# Altium footprint library aiskylab-01Resistors.PcbLib: 208 footprints (part 11 of 13)
Each footprint in its own frame and in the unit in brackets; x right, y up, seen from the top. Pads: shape width x height; smd on the part's side, far side on the other; paste and mask are expansions set on the pad; w line width, h text height; cw(c..) or ccw(c..) is an arc to the next point about the centre after c.
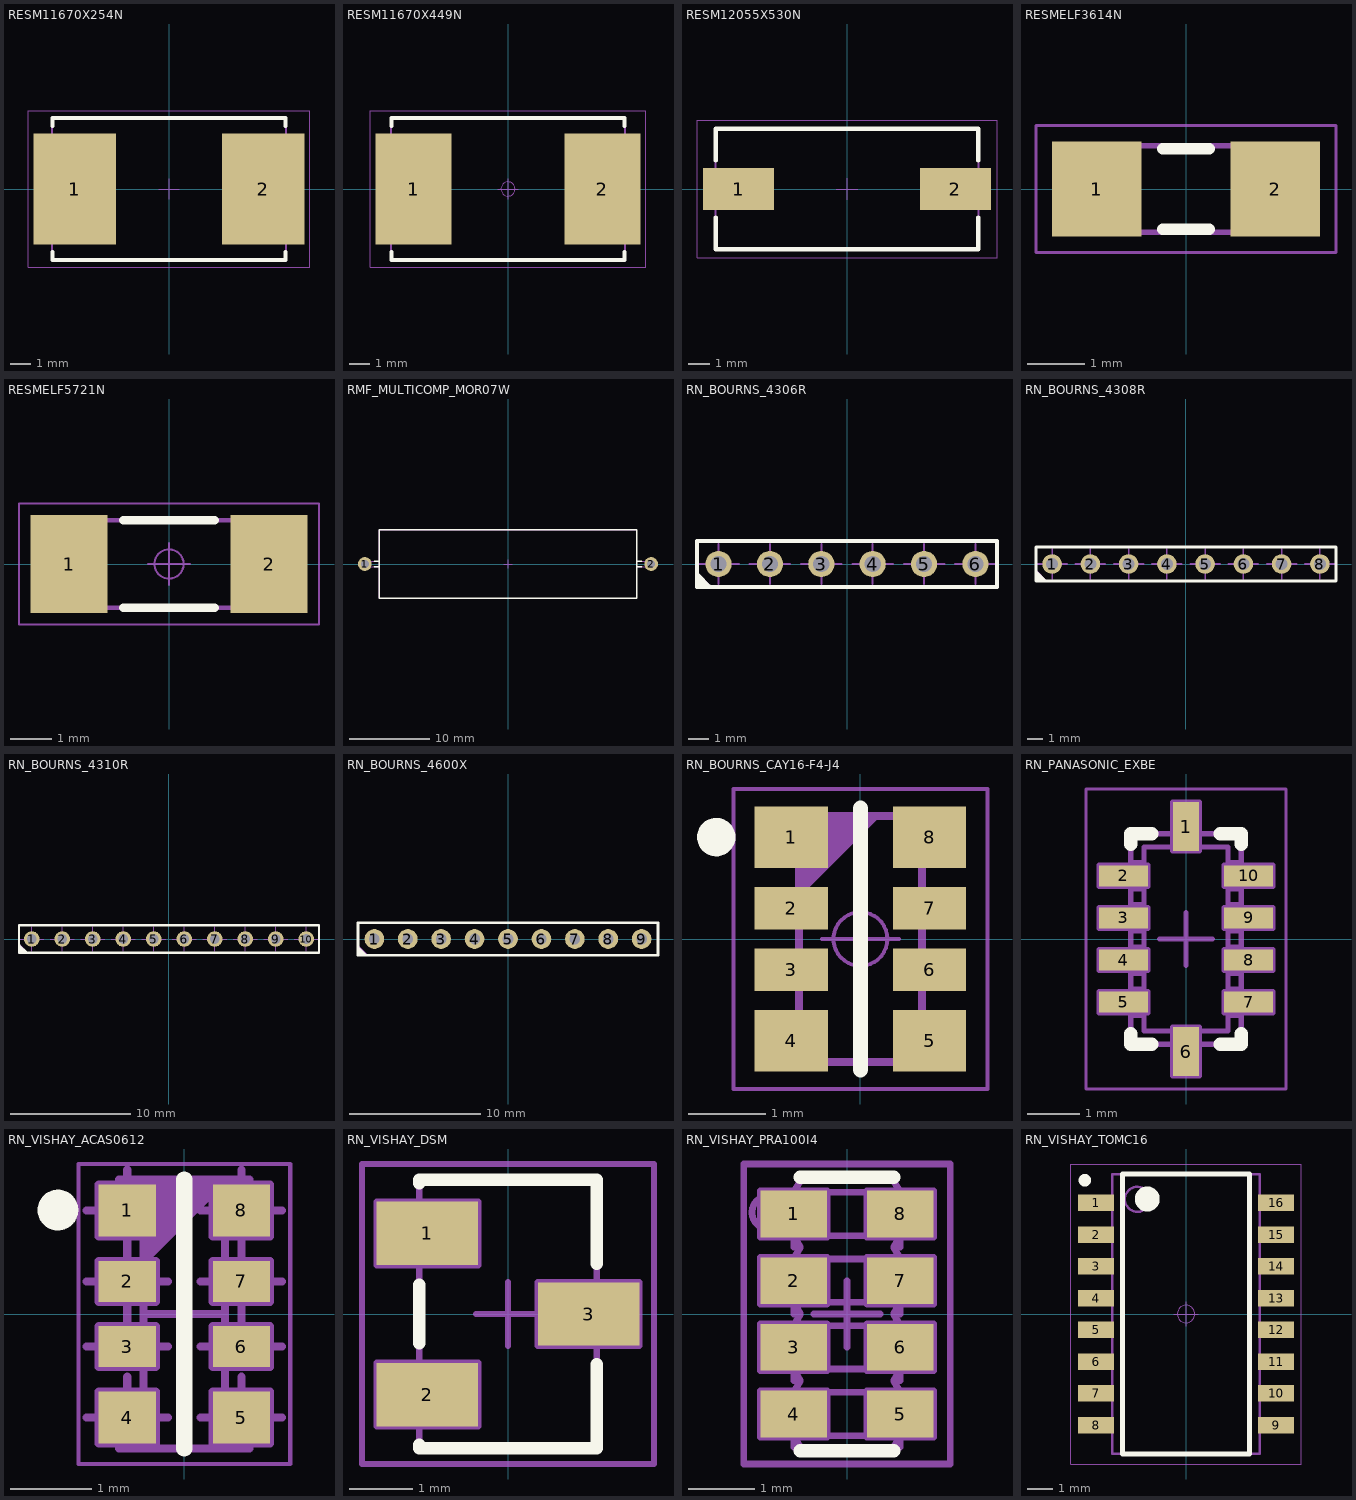
[diagram p10: the footprints below, top view; thin cyan lines are the x and y axes]

## RESM11670X254N [mm] "Resistor, Molded Body; 11.56mm L X 6.98mm W X 2.537mm H, IPC Medium Density"
height 2.54
pads (2):
  rect 4.05x5.5 smd: 1(-4.65,0) 2(4.65,0)
Top Overlay:
  lines w0.2: -5.75,-3.1 -5.75,-3.5 5.75,-3.5 5.75,-3.1 ; -5.75,3.1 -5.75,3.5 5.75,3.5 5.75,3.1
Top Designator:
  text ".Designator" at -7.618,-0.508 h1.52
Top Assembly:
  lines w0.1: -5.78,-3.49 -5.78,3.49 5.78,3.49 5.78,-3.49 -5.78,-3.49
Bottom 3D Body:
  lines w0.05: -0.5,0 0.5,0 ; 0,-0.5 0,0.5 ; -6.95,-3.85 6.95,-3.85 6.95,3.85 -6.95,3.85 -6.95,-3.85
3D body "p550-405.stp": height 0.02, standoff 0, extent -6.675,-2.75 -2.625,2.75
3D body "p550-405.stp": height 0.02, standoff 0, extent 2.625,-2.75 6.675,2.75
3D body "RESM11670X254N.stp": height 2.54, standoff 0, extent -6.186,-3.553 6.187,3.554

## RESM11670X449N [mm] "Resistor, Molded Body; 11.56mm L X 6.98mm W X 4.49mm H, IPC Medium Density"
height 4.49
pads (2):
  rect 3.75x5.5 smd: 1(-4.65,0) 2(4.65,0)
Top Overlay:
  lines w0.2: -5.75,-3.1 -5.75,-3.5 5.75,-3.5 5.75,-3.1 ; -5.75,3.1 -5.75,3.5 5.75,3.5 5.75,3.1
Top Designator:
  text ".Designator" at -7.618,-0.508 h1.52
Top Assembly:
  lines w0.1: -5.78,-3.49 -5.78,3.49 5.78,3.49 5.78,-3.49 -5.78,-3.49
Bottom 3D Body:
  circle w0.05: c0,0 r0.35
  lines w0.05: -0.5,0 0.5,0 ; 0,-0.5 0,0.5 ; -6.8,-3.85 6.8,-3.85 6.8,3.85 -6.8,3.85 -6.8,-3.85
3D body "RESM11670X449N.stp": height 4.49, standoff 0, extent -6.186,-3.553 6.187,3.554
3D body "p550-375.stp": height 0.02, standoff 0, extent -6.525,-2.725 -2.775,2.775
3D body "p550-375.stp": height 0.02, standoff 0, extent 2.8,-2.75 6.55,2.75

## RESM12055X530N [mm] "Resistor, Molded Body; 12mm L X 5.5mm W X 5.3mm H, IPC Medium Density"
height 5.3
pads (2):
  rect 3.25x1.9 smd: 1(-4.95,0) 2(4.95,0)
Top Overlay:
  lines w0.2: -6,-1.3 -6,-2.75 6,-2.75 6,-1.3 ; -6,1.3 -6,2.75 6,2.75 6,1.3
Top Designator:
  text ".Designator" at -7.618,-0.508 h1.52
Top Assembly:
  lines w0.1: -6,-2.75 -6,2.75 6,2.75 6,-2.75 -6,-2.75
Bottom 3D Body:
  lines w0.05: -0.5,0 0.5,0 ; 0,-0.5 0,0.5 ; -6.85,-3.15 6.85,-3.15 6.85,3.15 -6.85,3.15 -6.85,-3.15
3D body "p325-190.stp": height 0.02, standoff 0, extent -6.575,-0.95 -3.325,0.95
3D body "p325-190.stp": height 0.02, standoff 0, extent 3.325,-0.95 6.575,0.95
3D body "RESM12055X530N.stp": height 5, standoff 0, extent -6,-2.9 6,2.9

## RESMELF3614N [mm] "MELF Resistor, 2-Leads, Body 3.6x1.4mm, IPC Medium Density"
height 1.5
pads (2):
  rect 1.55x1.65 smd: 1(-1.55,0) 2(1.55,0)
Top Overlay:
  lines w0.2: -0.4,-0.7 0.4,-0.7 ; -0.4,0.7 0.4,0.7
Top Designator:
  text ".Designator" at -7.618,-0.508 h1.52
Top Assembly:
  lines w0.1: -1.9,-0.75 -1.9,0.75 1.9,0.75 1.9,-0.75 -1.9,-0.75
Bottom 3D Body:
  lines w0.05: -2.6,-1.1 -2.6,1.1 2.6,1.1 2.6,-1.1 -2.6,-1.1
3D body "p165-155.stp": height 0.02, standoff 0, extent 0.775,-0.825 2.325,0.825
3D body "RESMELF3614N.stp": height 1.5, standoff 0, extent -1.9,-0.75 1.9,0.75
3D body "p165-155.stp": height 0.02, standoff 0, extent -2.325,-0.825 -0.775,0.825

## RESMELF5721N [mm] "MELF Resistor, 2-Leads, Body 5.7x2.1mm, IPC Medium Density"
height 2.2
pads (2):
  rect 1.85x2.35 smd: 1(-2.4,0) 2(2.4,0)
Top Overlay:
  lines w0.2: -1.1,-1.05 1.1,-1.05 ; -1.1,1.05 1.1,1.05
Top Designator:
  text ".Designator" at -7.618,-0.508 h1.52
Top Assembly:
  lines w0.1: -2.85,-1.05 -2.85,1.05 2.85,1.05 2.85,-1.05 -2.85,-1.05
Bottom 3D Body:
  circle w0.05: c0,0 r0.35
  lines w0.05: -0.5,0 0.5,0 ; 0,-0.5 0,0.5 ; -3.6,-1.45 3.6,-1.45 3.6,1.45 -3.6,1.45 -3.6,-1.45
3D body "p235-185.stp": height 0.02, standoff 0, extent -3.325,-1.175 -1.475,1.175
3D body "p235-185.stp": height 0.02, standoff 0, extent 1.475,-1.175 3.325,1.175
3D body "RESMELF5822N.stp": height 2.3, standoff 0.1, extent -2.9,-1.1 2.9,1.1

## RMF_MULTICOMP_MOR07W [mm] "Resistor, Axial, Leads Spacing 35.56mm, Lead Dia. 0.7, Body Lengh 32mm, Diameter 8.5mm"
height 8.5
pads (2):
  round 1.7 hole 1: 1(-17.78,0) 2(17.78,0)
Top Overlay:
  lines w0.2: -16.58,-0.35 -16,-0.35 ; -16.58,0.35 -16,0.35 ; 16,-0.35 16.58,-0.35 ; 16,0.35 16.58,0.35 ; -16,-4.25 16,-4.25 16,4.25 -16,4.25 -16,-4.25
Top Designator:
  text ".Designator" at -7.617,-0.508 h1.52
Top Assembly:
  lines w0.1: -16,-0.35 -17.78,-0.35 cw(c-17.78,0) -17.78,0.35 -16,0.35 ; 16,-0.35 17.78,-0.35 ccw(c17.78,0) 17.78,0.35 16,0.35 ; -16,-4.25 -16,4.25 16,4.25 16,-4.25 -16,-4.25
Top Dimensions:
  lines w0.1: -18.28,0 -17.78,0 ; -17.78,-0.5 -17.78,0 ; -17.78,0.5 -17.78,0 ; -17.28,0 -17.78,0 ; -0.5,0 0,0 ; 0,-0.5 0,0 ; 0,0.5 0,0 ; 0.5,0 0,0 ; 17.28,0 17.78,0 ; 17.78,-0.5 17.78,0 ; 17.78,0.5 17.78,0 ; 18.28,0 17.78,0
3D body "v200-130.stp": height 0.02, standoff -1.65, extent 16.78,-1 18.78,1
3D body "v200-130.stp": height 0.02, standoff -1.65, extent -18.78,-1 -16.78,1
3D body "RMF_MULTICOMP_MOR07W.stp": height 8.5, standoff -3.8, extent -18.13,-4.25 18.13,4.25

## RN_BOURNS_4306R [mm] "SIP-6 Resistor Network, Body 14.83 x 2.16mm, Bourns Serie 4300R"
height 4.95
pads (6):
  round 1.3 hole 0.8: 1(-6.35,0) 2(-3.81,0) 3(-1.27,0) 4(1.27,0) 5(3.81,0) 6(6.35,0)
Top Overlay:
  lines w0.2: -7.4,-0.975 -7.25,-1.125 ; -7.4,-0.825 -7.1,-1.125 ; -7.4,-0.7 -6.975,-1.125 ; -7.4,-0.525 -6.8,-1.125 ; -7.415,-1.13 7.415,-1.13 7.415,1.13 -7.415,1.13 -7.415,-1.13
Top Designator:
  text ".Designator" at -7.618,-0.508 h1.52
Top Assembly:
  lines w0.1: -7.4,-1.05 -7.325,-1.125 ; -7.4,-0.95 -7.225,-1.125 ; -7.4,-0.875 -7.15,-1.125 ; -7.4,-0.8 -7.075,-1.125 ; -7.4,-0.725 -7,-1.125 ; -7.4,-0.65 -6.925,-1.125 ; -7.4,-0.575 -6.85,-1.125 ; -7.4,-0.45 -6.725,-1.125 ; -7.415,-1.13 -7.415,1.13 7.415,1.13 7.415,-1.13 -7.415,-1.13
Top Dimensions:
  lines w0.1: -7.35,0 -6.35,0 ; -6.35,-1 -6.35,0 ; -6.35,1 -6.35,0 ; -5.35,0 -6.35,0 ; -4.81,0 -3.81,0 ; -3.81,-1 -3.81,0 ; -3.81,1 -3.81,0 ; -2.81,0 -3.81,0 ; -2.27,0 -1.27,0 ; -1.27,-1 -1.27,0 ; -1.27,1 -1.27,0 ; -0.27,0 -1.27,0 ; 0.27,0 1.27,0 ; 1.27,-1 1.27,0 ; 1.27,1 1.27,0 ; 2.27,0 1.27,0 ; 2.81,0 3.81,0 ; 3.81,-1 3.81,0 ; 3.81,1 3.81,0 ; 4.81,0 3.81,0 ; 5.35,0 6.35,0 ; 6.35,-1 6.35,0 ; 6.35,1 6.35,0 ; 7.35,0 6.35,0
3D body "v200-130.stp": height 0.02, standoff -1.65, extent -4.81,-1 -2.81,1
3D body "v200-130.stp": height 0.02, standoff -1.65, extent -7.35,-1 -5.35,1
3D body "v200-130.stp": height 0.02, standoff -1.65, extent 2.81,-1 4.81,1
3D body "v200-130.stp": height 0.02, standoff -1.65, extent 0.27,-1 2.27,1
3D body "v200-130.stp": height 0.02, standoff -1.65, extent -2.27,-1 -0.27,1
3D body "v200-130.stp": height 0.02, standoff -1.65, extent 5.35,-1 7.35,1
3D body "RN_BOURNS_4306R.stp": height 4.95, standoff -3.79, extent -7.415,-1.13 7.415,1.13

## RN_BOURNS_4308R [mm] "SIP-8 Resistor Network, Body 19.92x 2.16mm, Bourns Serie 4300R"
height 4.95
pads (8):
  round 1.3 hole 0.8: 1(-8.89,0) 2(-6.35,0) 3(-3.81,0) 4(-1.27,0) 5(1.27,0) 6(3.81,0) 7(6.35,0) 8(8.89,0)
Top Overlay:
  lines w0.2: -9.94,-0.975 -9.79,-1.125 ; -9.94,-0.825 -9.64,-1.125 ; -9.94,-0.7 -9.515,-1.125 ; -9.94,-0.525 -9.34,-1.125 ; -9.955,-1.13 9.955,-1.13 9.955,1.13 -9.955,1.13 -9.955,-1.13
Top Designator:
  text ".Designator" at -7.618,-0.508 h1.52
Top Assembly:
  lines w0.1: -9.94,-1.05 -9.865,-1.125 ; -9.94,-0.95 -9.765,-1.125 ; -9.94,-0.875 -9.69,-1.125 ; -9.94,-0.8 -9.615,-1.125 ; -9.94,-0.725 -9.54,-1.125 ; -9.94,-0.65 -9.465,-1.125 ; -9.94,-0.575 -9.39,-1.125 ; -9.94,-0.45 -9.265,-1.125 ; -9.955,-1.13 -9.955,1.13 9.955,1.13 9.955,-1.13 -9.955,-1.13
Top Dimensions:
  lines w0.1: -9.89,0 -8.89,0 ; -8.89,-1 -8.89,0 ; -8.89,1 -8.89,0 ; -7.89,0 -8.89,0 ; -7.35,0 -6.35,0 ; -6.35,-1 -6.35,0 ; -6.35,1 -6.35,0 ; -5.35,0 -6.35,0 ; -4.81,0 -3.81,0 ; -3.81,-1 -3.81,0 ; -3.81,1 -3.81,0 ; -2.81,0 -3.81,0 ; -2.27,0 -1.27,0 ; -1.27,-1 -1.27,0 ; -1.27,1 -1.27,0 ; -0.27,0 -1.27,0 ; 0.27,0 1.27,0 ; 1.27,-1 1.27,0 ; 1.27,1 1.27,0 ; 2.27,0 1.27,0 ; 2.81,0 3.81,0 ; 3.81,-1 3.81,0 ; 3.81,1 3.81,0 ; 4.81,0 3.81,0 ; 5.35,0 6.35,0 ; 6.35,-1 6.35,0 ; 6.35,1 6.35,0 ; 7.35,0 6.35,0 ; 7.89,0 8.89,0 ; 8.89,-1 8.89,0 ; 8.89,1 8.89,0 ; 9.89,0 8.89,0
3D body "v200-130.stp": height 0.02, standoff -1.65, extent -4.81,-1 -2.81,1
3D body "v200-130.stp": height 0.02, standoff -1.65, extent -7.35,-1 -5.35,1
3D body "v200-130.stp": height 0.02, standoff -1.65, extent 2.81,-1 4.81,1
3D body "v200-130.stp": height 0.02, standoff -1.65, extent 0.27,-1 2.27,1
3D body "v200-130.stp": height 0.02, standoff -1.65, extent 7.89,-1 9.89,1
3D body "v200-130.stp": height 0.02, standoff -1.65, extent -2.27,-1 -0.27,1
3D body "v200-130.stp": height 0.02, standoff -1.65, extent -9.89,-1 -7.89,1
3D body "v200-130.stp": height 0.02, standoff -1.65, extent 5.35,-1 7.35,1
3D body "RN_BOURNS_4308R.stp": height 4.95, standoff -3.79, extent -9.955,-1.13 9.955,1.13

## RN_BOURNS_4310R [mm] "SIP-10 Resistor Network, Body 24.99x 2.16mm, Bourns Serie 4300R"
height 4.95
pads (10):
  round 1.3 hole 0.8: 1(-11.43,0) 2(-8.89,0) 3(-6.35,0) 4(-3.81,0) 5(-1.27,0) 6(1.27,0) 7(3.81,0) 8(6.35,0) 9(8.89,0) 10(11.43,0)
Top Overlay:
  lines w0.2: -12.48,-0.975 -12.33,-1.125 ; -12.48,-0.825 -12.18,-1.125 ; -12.48,-0.7 -12.055,-1.125 ; -12.48,-0.525 -11.88,-1.125 ; -12.495,-1.13 12.495,-1.13 12.495,1.13 -12.495,1.13 -12.495,-1.13
Top Designator:
  text ".Designator" at -7.618,-0.508 h1.52
Top Assembly:
  lines w0.1: -12.48,-1.05 -12.405,-1.125 ; -12.48,-0.95 -12.305,-1.125 ; -12.48,-0.875 -12.23,-1.125 ; -12.48,-0.8 -12.155,-1.125 ; -12.48,-0.725 -12.08,-1.125 ; -12.48,-0.65 -12.005,-1.125 ; -12.48,-0.575 -11.93,-1.125 ; -12.48,-0.45 -11.805,-1.125 ; 12.495,-1.13 12.495,1.13 ; 12.495,-1.13 12.495,1.13 ; 12.495,-1.13 -12.495,-1.13 -12.495,1.13 12.495,1.13
Top Dimensions:
  lines w0.1: -12.43,0 -11.43,0 ; -11.43,-1 -11.43,0 ; -11.43,1 -11.43,0 ; -10.43,0 -11.43,0 ; -9.89,0 -8.89,0 ; -8.89,-1 -8.89,0 ; -8.89,1 -8.89,0 ; -7.89,0 -8.89,0 ; -7.35,0 -6.35,0 ; -6.35,-1 -6.35,0 ; -6.35,1 -6.35,0 ; -5.35,0 -6.35,0 ; -4.81,0 -3.81,0 ; -3.81,-1 -3.81,0 ; -3.81,1 -3.81,0 ; -2.81,0 -3.81,0 ; -2.27,0 -1.27,0 ; -1.27,-1 -1.27,0 ; -1.27,1 -1.27,0 ; -0.27,0 -1.27,0 ; 0.27,0 1.27,0 ; 1.27,-1 1.27,0 ; 1.27,1 1.27,0 ; 2.27,0 1.27,0 ; 2.81,0 3.81,0 ; 3.81,-1 3.81,0 ; 3.81,1 3.81,0 ; 4.81,0 3.81,0 ; 5.35,0 6.35,0 ; 6.35,-1 6.35,0 ; 6.35,1 6.35,0 ; 7.35,0 6.35,0 ; 7.89,0 8.89,0 ; 8.89,-1 8.89,0 ; 8.89,1 8.89,0 ; 9.89,0 8.89,0 ; 10.43,0 11.43,0 ; 11.43,-1 11.43,0 ; 11.43,1 11.43,0 ; 12.43,0 11.43,0
3D body "v200-130.stp": height 0.02, standoff -1.65, extent -12.43,-1 -10.43,1
3D body "v200-130.stp": height 0.02, standoff -1.65, extent -4.81,-1 -2.81,1
3D body "v200-130.stp": height 0.02, standoff -1.65, extent -7.35,-1 -5.35,1
3D body "v200-130.stp": height 0.02, standoff -1.65, extent 2.81,-1 4.81,1
3D body "v200-130.stp": height 0.02, standoff -1.65, extent 0.27,-1 2.27,1
3D body "v200-130.stp": height 0.02, standoff -1.65, extent 10.43,-1 12.43,1
3D body "v200-130.stp": height 0.02, standoff -1.65, extent 7.89,-1 9.89,1
3D body "v200-130.stp": height 0.02, standoff -1.65, extent -2.27,-1 -0.27,1
3D body "v200-130.stp": height 0.02, standoff -1.65, extent -9.89,-1 -7.89,1
3D body "v200-130.stp": height 0.02, standoff -1.65, extent 5.35,-1 7.35,1
3D body "RN_BOURNS_4310R.stp": height 4.95, standoff -3.79, extent -12.495,-1.13 12.495,1.13

## RN_BOURNS_4600X [mm] "SIP-9 Resistor Network, Body 22.81x 2.49mm, Bourns Serie 4600X"
height 5.08
pads (9):
  round 1.5 hole 0.8: 1(-10.16,0) 2(-7.62,0) 3(-5.08,0) 4(-2.54,0) 5(0,0) 6(2.54,0) 7(5.08,0) 8(7.62,0) 9(10.16,0)
Top Overlay:
  lines w0.2: -11.39,-1.09 -11.24,-1.24 ; -11.39,-0.94 -11.09,-1.24 ; -11.39,-0.815 -10.965,-1.24 ; -11.39,-0.64 -10.79,-1.24 ; -11.405,-1.245 11.405,-1.245 11.405,1.245 -11.405,1.245 -11.405,-1.245
Top Designator:
  text ".Designator" at -7.618,-0.508 h1.52
Top Assembly:
  lines w0.1: -11.39,-1.165 -11.315,-1.24 ; -11.39,-1.065 -11.215,-1.24 ; -11.39,-0.99 -11.14,-1.24 ; -11.39,-0.915 -11.065,-1.24 ; -11.39,-0.84 -10.99,-1.24 ; -11.39,-0.765 -10.915,-1.24 ; -11.39,-0.69 -10.84,-1.24 ; -11.39,-0.565 -10.715,-1.24 ; -11.405,-1.245 -11.405,1.245 11.405,1.245 11.405,-1.245 -11.405,-1.245
Top Dimensions:
  lines w0.127: -10.66,0 -10.16,0 ; -10.16,-0.5 -10.16,0 ; -10.16,0.5 -10.16,0 ; -9.66,0 -10.16,0 ; -8.12,0 -7.62,0 ; -7.62,-0.5 -7.62,0 ; -7.62,0.5 -7.62,0 ; -7.12,0 -7.62,0 ; -5.58,0 -5.08,0 ; -5.08,-0.5 -5.08,0 ; -5.08,0.5 -5.08,0 ; -4.58,0 -5.08,0 ; -3.04,0 -2.54,0 ; -2.54,-0.5 -2.54,0 ; -2.54,0.5 -2.54,0 ; -2.04,0 -2.54,0 ; -0.5,0 0,0 ; 0,-0.5 0,0 ; 0,0.5 0,0 ; 0.5,0 0,0 ; 2.04,0 2.54,0 ; 2.54,-0.5 2.54,0 ; 2.54,0.5 2.54,0 ; 3.04,0 2.54,0 ; 4.58,0 5.08,0 ; 5.08,-0.5 5.08,0 ; 5.08,0.5 5.08,0 ; 5.58,0 5.08,0 ; 7.12,0 7.62,0 ; 7.62,-0.5 7.62,0 ; 7.62,0.5 7.62,0 ; 8.12,0 7.62,0 ; 9.66,0 10.16,0 ; 10.16,-0.5 10.16,0 ; 10.16,0.5 10.16,0 ; 10.66,0 10.16,0
3D body "v200-130.stp": height 0.02, standoff -1.65, extent -6.08,-1 -4.08,1
3D body "v200-130.stp": height 0.02, standoff -1.65, extent 4.08,-1 6.08,1
3D body "v200-130.stp": height 0.02, standoff -1.65, extent -11.16,-1 -9.16,1
3D body "v200-130.stp": height 0.02, standoff -1.65, extent -3.54,-1 -1.54,1
3D body "v200-130.stp": height 0.02, standoff -1.65, extent -8.62,-1 -6.62,1
3D body "v200-130.stp": height 0.02, standoff -1.65, extent 1.54,-1 3.54,1
3D body "v200-130.stp": height 0.02, standoff -1.65, extent -1,-1 1,1
3D body "v200-130.stp": height 0.02, standoff -1.65, extent 9.16,-1 11.16,1
3D body "v200-130.stp": height 0.02, standoff -1.65, extent 6.62,-1 8.62,1
3D body "RN_BOURNS_4600X.stp": height 5.08, standoff -3.43, extent -11.405,-1.245 11.405,1.245

## RN_BOURNS_CAY16-F4-J4 [mm] "Resistor, Chip Array, Convex S Version, Pitch 0.80mm, 8-Leads,1.6x3.2mm, BOURNS Type CAY16-F4 or J4, IPC Medium Density"
height 0.6
pads (8):
  rect 0.95x0.8 smd: 1(-0.9,1.325) 4(-0.9,-1.325) 5(0.9,-1.325) 8(0.9,1.325)
  rect 0.95x0.55 smd: 2(-0.9,0.4) 3(-0.9,-0.4) 6(0.9,-0.4) 7(0.9,0.4)
Top Overlay:
  circle w0.25: c-1.875,1.325 r0.125
  lines w0.2: 0,-1.7 0,1.7
Top Designator:
  text ".Designator" at -7.843,-0.508 h1.52
Top Assembly:
  lines w0.1: -0.8,-1.6 -0.8,1.6 0.8,1.6 0.8,-1.6 -0.8,-1.6 ; -0.8,0.6 0.2,1.6 -0.8,0.6 ; -0.8,0.7 0.1,1.6 -0.8,0.7 ; -0.8,0.8 0,1.6 -0.8,0.8 ; -0.8,0.9 -0.1,1.6 -0.8,0.9 ; -0.8,1 -0.2,1.6 -0.8,1 ; -0.8,1.1 -0.3,1.6 -0.8,1.1 ; -0.8,1.2 -0.4,1.6 -0.8,1.2 ; -0.8,1.3 -0.5,1.6 -0.8,1.3 ; -0.8,1.4 -0.6,1.6 -0.8,1.4 ; -0.8,1.5 -0.7,1.6 -0.8,1.5
Bottom 3D Body:
  circle w0.05: c0,0 r0.35
  lines w0.05: -0.5,0 0.5,0 ; 0,-0.5 0,0.5 ; -1.65,-1.95 -1.65,1.95 1.65,1.95 1.65,-1.95 -1.65,-1.95
3D body "p095-055.stp": height 0.02, standoff 0, extent -1.375,-0.675 -0.425,-0.125
3D body "p095-080.stp": height 0.02, standoff 0, extent -1.375,-1.725 -0.425,-0.925
3D body "p095-055.stp": height 0.02, standoff 0, extent -1.375,0.125 -0.425,0.675
3D body "p095-080.stp": height 0.02, standoff 0, extent -1.375,0.925 -0.425,1.725
3D body "p095-055.stp": height 0.02, standoff 0, extent 0.425,-0.675 1.375,-0.125
3D body "p095-080.stp": height 0.02, standoff 0, extent 0.425,-1.725 1.375,-0.925
3D body "p095-055.stp": height 0.02, standoff 0, extent 0.425,0.125 1.375,0.675
3D body "p095-080.stp": height 0.02, standoff 0, extent 0.425,0.925 1.375,1.725
3D body "RN_BOURNS_CAY16-F4-J4.stp": height 0.5, standoff 0, extent -0.8,-1.65 0.8,1.65

## RN_PANASONIC_EXBE [mm] "Resistor, Chip Array, Concave, Pitch 0.80mm, 10 Pin, 2.1mm W X 4.0mm L X 2.3mm H, Type EXBE"
height 2.3
pads (10):
  rect 0.5x0.925 smd: 1(0,2.138) 6(0,-2.137)
  rect 0.925x0.4 smd: 2(-1.188,1.2) 3(-1.188,0.4) 4(-1.188,-0.4) 5(-1.188,-1.2) 7(1.188,-1.2) 8(1.188,-0.4) 9(1.188,0.4) 10(1.188,1.2)
Top Overlay:
  lines w0.25: -1.05,-1.8 -1.05,-2 -0.65,-2 ; -1.05,1.8 -1.05,2 -0.65,2 ; 0.65,-2 1.05,-2 1.05,-1.8 ; 0.65,2 1.05,2 1.05,1.8
Top Designator:
  text ".Designator" at -7.618,-0.508 h1.52
Top Assembly:
  lines w0.1: -1.05,-1.45 -0.8,-1.45 ; -1.05,-0.95 -0.8,-0.95 ; -1.05,-0.65 -0.8,-0.65 ; -1.05,-0.15 -0.8,-0.15 ; -1.05,0.15 -0.8,0.15 ; -1.05,0.65 -0.8,0.65 ; -1.05,0.95 -0.8,0.95 ; -1.05,1.45 -0.8,1.45 ; -0.25,-2 -0.25,-1.75 ; -0.25,1.75 -0.25,2 ; 0.25,-2 0.25,-1.75 ; 0.25,1.75 0.25,2 ; 0.8,-1.45 1.05,-1.45 ; 0.8,-0.95 1.05,-0.95 ; 0.8,-0.65 1.05,-0.65 ; 0.8,-0.15 1.05,-0.15 ; 0.8,0.15 1.05,0.15 ; 0.8,0.65 1.05,0.65 ; 0.8,0.95 1.05,0.95 ; 0.8,1.45 1.05,1.45 ; -1.05,-2 -1.05,-1.35 ccw(c-1.05,-1.2) -1.05,-1.05 -1.05,-0.55 ccw(c-1.05,-0.4) -1.05,-0.25 -1.05,0.25 ccw(c-1.05,0.4) -1.05,0.55 -1.05,1.05 ccw(c-1.05,1.2) -1.05,1.35 -1.05,2 -0.15,2 ccw(c0,2) 0.15,2 1.05,2 1.05,1.35 ccw(c1.05,1.2) 1.05,1.05 1.05,0.55 ccw(c1.05,0.4) 1.05,0.25 1.05,-0.25 ccw(c1.05,-0.4) 1.05,-0.55 1.05,-1.05 ccw(c1.05,-1.2) 1.05,-1.35 1.05,-2 0.15,-2 ccw(c0,-2) -0.15,-2 -1.05,-2 ; -0.8,-1.75 -0.8,1.75 0.8,1.75 0.8,-1.75 -0.8,-1.75
Top Dimensions:
  lines w0.1: -0.5,0 0,0 ; 0,-0.5 0,0 ; 0,0.5 0,0 ; 0.5,0 0,0 ; -1.65,-1.4 -1.65,-1 ; -1.65,-1.4 -0.725,-1.4 -0.725,-1 -1.65,-1 ; -1.65,-1.4 -1.188,-1.2 -1.65,-1 ; -1.65,-0.6 -1.65,-0.2 ; -1.65,-0.6 -0.725,-0.6 -0.725,-0.2 -1.65,-0.2 ; -1.65,-0.6 -1.188,-0.4 -1.65,-0.2 ; -1.65,0.2 -1.65,0.6 ; -1.65,0.2 -0.725,0.2 -0.725,0.6 -1.65,0.6 ; -1.65,0.2 -1.188,0.4 -1.65,0.6 ; -1.65,1 -1.65,1.4 ; -1.65,1 -0.725,1 -0.725,1.4 -1.65,1.4 ; -1.65,1 -1.188,1.2 -1.65,1.4 ; -0.25,-2.6 0.25,-2.6 ; -0.25,-2.6 -0.25,-1.675 0.25,-1.675 0.25,-2.6 ; -0.25,-2.6 0,-2.137 0.25,-2.6 ; -0.25,2.6 0.25,2.6 ; -0.25,2.6 -0.25,1.675 0.25,1.675 0.25,2.6 ; -0.25,2.6 0,2.138 0.25,2.6 ; 1.65,-1.4 1.65,-1 ; 1.65,-1.4 0.725,-1.4 0.725,-1 1.65,-1 ; 1.65,-1.4 1.188,-1.2 1.65,-1 ; 1.65,-0.6 1.65,-0.2 ; 1.65,-0.6 0.725,-0.6 0.725,-0.2 1.65,-0.2 ; 1.65,-0.6 1.188,-0.4 1.65,-0.2 ; 1.65,0.2 1.65,0.6 ; 1.65,0.2 0.725,0.2 0.725,0.6 1.65,0.6 ; 1.65,0.2 1.188,0.4 1.65,0.6 ; 1.65,1 1.65,1.4 ; 1.65,1 0.725,1 0.725,1.4 1.65,1.4 ; 1.65,1 1.188,1.2 1.65,1.4
Bottom 3D Body:
  lines w0.05: -1.9,-2.85 -1.9,2.85 1.9,2.85 1.9,-2.85 -1.9,-2.85
3D body "p093-040.stp": height 0.02, standoff 0, extent -1.665,-0.6 -0.735,-0.2
3D body "p093-040.stp": height 0.02, standoff 0, extent -1.665,-1.4 -0.735,-1
3D body "p093-040.stp": height 0.02, standoff 0, extent -1.665,1 -0.735,1.4
3D body "p093-040.stp": height 0.02, standoff 0, extent -1.665,0.2 -0.735,0.6
3D body "p093-040.stp": height 0.02, standoff 0, extent 0.71,-1.4 1.64,-1
3D body "p093-040.stp": height 0.02, standoff 0, extent 0.71,-0.6 1.64,-0.2
3D body "p093-040.stp": height 0.02, standoff 0, extent 0.71,0.2 1.64,0.6
3D body "p093-040.stp": height 0.02, standoff 0, extent 0.71,1 1.64,1.4
3D body "p093-040.stp": height 0.02, standoff 0, extent -0.2,-2.615 0.2,-1.685
3D body "p093-040.stp": height 0.02, standoff 0, extent -0.2,1.66 0.2,2.59
3D body "RN_PANASONIC_EXBE.stp": height 0.65, standoff 0, extent -1.05,-2 1.05,2

## RN_VISHAY_ACAS0612 [mm] "Resistor, Chip Array, Convex S Version, Pitch 0.80mm, 8-Leads,1.5x3.2mm, VISHAY Type ACAS 0612, IPC Medium Density"
height 0.45
pads (8):
  rect 0.7x0.64 smd: 1(-0.7,1.27) 4(-0.7,-1.27) 5(0.7,-1.27) 8(0.7,1.27)
  rect 0.7x0.5 smd: 2(-0.7,0.4) 3(-0.7,-0.4) 6(0.7,-0.4) 7(0.7,0.4)
Top Overlay:
  circle w0.25: c-1.55,1.275 r0.125
  lines w0.2: 0,-1.65 0,1.65
Top Designator:
  text ".Designator" at -7.855,-0.508 h1.52
Top Assembly:
  lines w0.1: -0.5,-1.65 -0.5,1.65 ; -0.5,-1.027 cw(c-0.6,-0.825) -0.6,-1.05 -0.8,-1.05 -0.8,-1.65 0.8,-1.65 0.8,-1.05 0.6,-1.05 cw(c0.6,-0.825) 0.5,-1.027 ; -0.5,-0.623 ccw(c-0.6,-0.825) -0.6,-0.6 -0.8,-0.6 -0.8,-0.2 -0.6,-0.2 ccw(c-0.6,0) -0.5,-0.173 ; -0.5,0.173 ccw(c-0.6,0) -0.6,0.2 -0.8,0.2 -0.8,0.6 -0.6,0.6 ccw(c-0.6,0.825) -0.5,0.623 ; -0.5,1.027 ccw(c-0.6,0.825) -0.6,1.05 -0.8,1.05 -0.8,1.65 0.8,1.65 0.8,1.05 0.6,1.05 ccw(c0.6,0.825) 0.5,1.027 ; 0.5,-1.65 0.5,1.65 ; 0.5,-0.623 cw(c0.6,-0.825) 0.6,-0.6 0.8,-0.6 0.8,-0.2 0.6,-0.2 cw(c0.6,0) 0.5,-0.173 ; 0.5,0.173 cw(c0.6,0) 0.6,0.2 0.8,0.2 0.8,0.6 0.6,0.6 cw(c0.6,0.825) 0.5,0.623 ; 0.5,1.65 -0.5,0.65 0.5,1.65 ; -0.5,0.75 0.4,1.65 -0.5,0.75 ; -0.5,0.85 0.3,1.65 -0.5,0.85 ; -0.5,0.95 0.2,1.65 -0.5,0.95 ; -0.5,1.05 0.1,1.65 -0.5,1.05 ; -0.5,1.15 0,1.65 -0.5,1.15 ; -0.5,1.25 -0.1,1.65 -0.5,1.25 ; -0.5,1.35 -0.2,1.65 -0.5,1.35 ; -0.5,1.45 -0.3,1.65 -0.5,1.45 ; -0.5,1.55 -0.4,1.65 -0.5,1.55
Top Dimensions:
  lines w0.1: -1.2,-1.27 -0.7,-1.27 ; -1.2,-0.4 -0.7,-0.4 ; -1.2,0.4 -0.7,0.4 ; -1.2,1.27 -0.7,1.27 ; -0.7,-0.77 -0.7,-1.27 ; -0.7,0.1 -0.7,-0.4 ; -0.7,0.9 -0.7,0.4 ; -0.7,1.77 -0.7,1.27 ; -0.5,0 0,0 ; -0.2,-1.27 -0.7,-1.27 ; -0.2,-0.4 -0.7,-0.4 ; -0.2,0.4 -0.7,0.4 ; -0.2,1.27 -0.7,1.27 ; 0,-0.5 0,0 ; 0,0.5 0,0 ; 0.2,-1.27 0.7,-1.27 ; 0.2,-0.4 0.7,-0.4 ; 0.2,0.4 0.7,0.4 ; 0.2,1.27 0.7,1.27 ; 0.5,0 0,0 ; 0.7,-0.77 0.7,-1.27 ; 0.7,0.1 0.7,-0.4 ; 0.7,0.9 0.7,0.4 ; 0.7,1.77 0.7,1.27 ; 1.2,-1.27 0.7,-1.27 ; 1.2,-0.4 0.7,-0.4 ; 1.2,0.4 0.7,0.4 ; 1.2,1.27 0.7,1.27 ; -1.05,-1.59 -1.05,-0.95 -0.35,-0.95 -0.35,-1.59 -1.05,-1.59 ; -1.05,-0.65 -1.05,-0.15 -0.35,-0.15 -0.35,-0.65 -1.05,-0.65 ; -1.05,0.15 -1.05,0.65 -0.35,0.65 -0.35,0.15 -1.05,0.15 ; -1.05,0.95 -1.05,1.59 -0.35,1.59 -0.35,0.95 -1.05,0.95 ; 0.35,-1.59 0.35,-0.95 1.05,-0.95 1.05,-1.59 0.35,-1.59 ; 0.35,-0.65 0.35,-0.15 1.05,-0.15 1.05,-0.65 0.35,-0.65 ; 0.35,0.15 0.35,0.65 1.05,0.65 1.05,0.15 0.35,0.15 ; 0.35,0.95 0.35,1.59 1.05,1.59 1.05,0.95 0.35,0.95
Bottom 3D Body:
  lines w0.05: -1.3,-1.84 1.3,-1.84 1.3,1.84 -1.3,1.84 -1.3,-1.84
3D body "p070-064.stp": height 0.02, standoff 0, extent -1.05,-1.595 -0.35,-0.955
3D body "p070-050.stp": height 0.02, standoff 0, extent -1.05,-0.65 -0.35,-0.15
3D body "p070-064.stp": height 0.02, standoff 0, extent -1.05,0.945 -0.35,1.585
3D body "p070-050.stp": height 0.02, standoff 0, extent -1.05,0.15 -0.35,0.65
3D body "p070-064.stp": height 0.02, standoff 0, extent 0.35,-1.595 1.05,-0.955
3D body "p070-050.stp": height 0.02, standoff 0, extent 0.35,-0.65 1.05,-0.15
3D body "p070-064.stp": height 0.02, standoff 0, extent 0.35,0.945 1.05,1.585
3D body "p070-050.stp": height 0.02, standoff 0, extent 0.35,0.15 1.05,0.65
3D body "RN_VISHAY_ACAS0612.stp": height 0.55, standoff 0, extent -0.8,-1.65 0.8,1.65

## RN_VISHAY_DSM [mm] "SOT23 3-Leads, Pitch 1.25m - Body 2.7x4mm, DSM Serie"
height 1.8
pads (3):
  rect 1.6x1 smd: 1(-1.27,1.27) 2(-1.27,-1.27) 3(1.27,0)
Top Overlay:
  lines w0.2: -1.398,-2.06 -1.398,-2.113 1.398,-2.113 1.398,-0.79 ; -1.398,-0.46 -1.398,0.46 ; -1.398,2.06 -1.398,2.113 1.398,2.113 1.398,0.79
Top Designator:
  text ".Designator" at -7.618,-0.508 h1.52
Top Assembly:
  lines w0.1: -1.398,-1.67 -1.515,-1.67 -1.515,-0.87 -1.398,-0.87 ; -1.398,0.87 -1.515,0.87 -1.515,1.67 -1.385,1.67 ; 1.398,-0.4 1.515,-0.4 1.515,0.4 1.398,0.4 ; -1.398,2.113 -1.398,-2.113 1.398,-2.113 1.398,2.113 ; -1.398,2.113 1.398,2.113 ; -1.398,2.113 1.398,2.113
Top Dimensions:
  lines w0.1: -2.07,-1.27 -0.47,-1.27 ; -1.77,-1.27 -1.27,-1.27 ; -1.77,1.27 -1.27,1.27 ; -1.27,-1.77 -1.27,-1.27 ; -1.27,-0.77 -1.27,-1.27 ; -1.27,0.77 -1.27,1.27 ; -1.27,1.77 -1.27,1.27 ; -0.77,-1.27 -1.27,-1.27 ; -0.77,1.27 -1.27,1.27 ; -0.5,0 0,0 ; 0,-0.5 0,0 ; 0,0.5 0,0 ; 0.5,0 0,0 ; 0.77,0 1.27,0 ; 1.27,-0.5 1.27,0 ; 1.27,0.5 1.27,0 ; 1.77,0 1.27,0 ; -2.07,-1.77 -2.07,-0.77 -0.47,-0.77 -0.47,-1.77 -2.07,-1.77 ; -2.07,0.77 -2.07,1.77 -0.47,1.77 -0.47,0.77 -2.07,0.77 ; 0.47,-0.5 0.47,0.5 2.07,0.5 2.07,-0.5 0.47,-0.5
Bottom 3D Body:
  lines w0.1: -2.3,-2.363 -2.3,2.363 2.3,2.363 2.3,-2.363 -2.3,-2.363
3D body "p160-100.stp": height 0.02, standoff 0, extent 0.475,-0.5 2.075,0.5
3D body "p160-100.stp": height 0.02, standoff 0, extent -2.075,-1.775 -0.475,-0.775
3D body "p160-100.stp": height 0.02, standoff 0, extent -2.075,0.775 -0.475,1.775
3D body "RN_VISHAY_DSM.stp": height 1.8, standoff 0, extent -1.515,-2.113 1.515,2.113

## RN_VISHAY_PRA100I4 [mm] "Resistor, Chip Array, Pitch 1mm, 8 Pin, 1.60mm W X 4mm L X 0.50mm H, Serie PRA100"
height 0.5
pads (8):
  rect 1x0.7 smd: 1(-0.8,1.5) 2(-0.8,0.5) 3(-0.8,-0.5) 4(-0.8,-1.5) 5(0.8,-1.5) 6(0.8,-0.5) 7(0.8,0.5) 8(0.8,1.5)
Top Overlay:
  lines w0.2: -0.7,-2.05 0.7,-2.05 ; -0.7,2.05 0.7,2.05
Top Designator:
  text ".Designator" at -7.618,-0.508 h1.52
Top Assembly:
  circle w0.1: c-1.175,1.525 r0.25
  lines w0.1: -0.4,-1.825 -0.4,-1.175 ; -0.4,-0.825 -0.4,-0.175 ; 0.4,-1.825 0.4,-1.175 ; 0.4,-0.825 0.4,-0.175 ; 0.4,0.175 0.4,0.825 ; 0.4,1.175 0.4,1.825 ; -0.8,-1.825 -0.8,-1.175 ; -0.8,-1.825 -0.7,-2 0.7,-2 0.8,-1.825 ; -0.8,-1.825 0.8,-1.825 ; -0.8,-1.175 -0.7,-1 -0.8,-0.825 ; -0.8,-1.175 0.8,-1.175 ; -0.8,-0.825 -0.8,-0.175 ; -0.8,-0.825 0.8,-0.825 ; -0.8,-0.175 -0.7,0 -0.8,0.175 ; -0.8,-0.175 0.8,-0.175 ; -0.8,0.175 -0.8,0.825 ; -0.8,0.175 0.8,0.175 ; -0.8,0.825 -0.7,1 -0.8,1.175 ; -0.8,0.825 0.8,0.825 ; -0.8,1.175 -0.8,1.825 ; -0.8,1.175 0.8,1.175 ; -0.8,1.825 -0.7,2 0.7,2 0.8,1.825 ; -0.8,1.825 0.8,1.825 ; 0.8,-1.825 0.8,-1.175 ; 0.8,-1.175 0.7,-1 0.8,-0.825 ; 0.8,-0.825 0.8,-0.175 ; 0.8,-0.175 0.7,0 0.8,0.175 ; 0.8,0.175 0.8,0.825 ; 0.8,0.825 0.7,1 0.8,1.175 ; 0.8,1.175 0.8,1.825 ; -0.4,0.175 -0.4,0.825 -0.4,0.175 ; -0.4,1.175 -0.4,1.825 -0.4,1.175
Top Dimensions:
  lines w0.1: -1.3,-1.5 -0.8,-1.5 ; -1.3,-0.5 -0.8,-0.5 ; -1.3,0.5 -0.8,0.5 ; -1.3,1.5 -0.8,1.5 ; -0.8,-2 -0.8,-1.5 ; -0.8,-1 -0.8,-0.5 ; -0.8,0 -0.8,0.5 ; -0.8,1 -0.8,1.5 ; -0.5,0 0,0 ; -0.3,-1.5 -0.8,-1.5 ; -0.3,-0.5 -0.8,-0.5 ; -0.3,0.5 -0.8,0.5 ; -0.3,1.5 -0.8,1.5 ; 0,-0.5 0,0 ; 0,0.5 0,0 ; 0.3,-1.5 0.8,-1.5 ; 0.3,-0.5 0.8,-0.5 ; 0.3,0.5 0.8,0.5 ; 0.3,1.5 0.8,1.5 ; 0.5,0 0,0 ; 0.8,-2 0.8,-1.5 ; 0.8,-1 0.8,-0.5 ; 0.8,0 0.8,0.5 ; 0.8,1 0.8,1.5 ; 1.3,-1.5 0.8,-1.5 ; 1.3,-0.5 0.8,-0.5 ; 1.3,0.5 0.8,0.5 ; 1.3,1.5 0.8,1.5 ; -1.3,-1.85 -0.3,-1.85 -0.3,-1.15 -1.3,-1.15 -1.3,-1.85 ; -1.3,-0.85 -0.3,-0.85 -0.3,-0.15 -1.3,-0.15 -1.3,-0.85 ; -1.3,0.15 -0.3,0.15 -0.3,0.85 -1.3,0.85 -1.3,0.15 ; -1.3,1.15 -0.3,1.15 -0.3,1.85 -1.3,1.85 -1.3,1.15 ; 0.3,-1.85 1.3,-1.85 1.3,-1.15 0.3,-1.15 0.3,-1.85 ; 0.3,-0.85 1.3,-0.85 1.3,-0.15 0.3,-0.15 0.3,-0.85 ; 0.3,0.15 1.3,0.15 1.3,0.85 0.3,0.85 0.3,0.15 ; 0.3,1.15 1.3,1.15 1.3,1.85 0.3,1.85 0.3,1.15
Bottom 3D Body:
  lines w0.1: -1.55,-2.25 1.55,-2.25 1.55,2.25 -1.55,2.25 -1.55,-2.25
3D body "p100-070.stp": height 0.02, standoff 0, extent -1.3,-1.85 -0.3,-1.15
3D body "p100-070.stp": height 0.02, standoff 0, extent -1.3,-0.85 -0.3,-0.15
3D body "p100-070.stp": height 0.02, standoff 0, extent -1.3,0.15 -0.3,0.85
3D body "p100-070.stp": height 0.02, standoff 0, extent -1.3,1.15 -0.3,1.85
3D body "p100-070.stp": height 0.02, standoff 0, extent 0.3,-0.85 1.3,-0.15
3D body "p100-070.stp": height 0.02, standoff 0, extent 0.3,-1.85 1.3,-1.15
3D body "p100-070.stp": height 0.02, standoff 0, extent 0.3,1.15 1.3,1.85
3D body "p100-070.stp": height 0.02, standoff 0, extent 0.3,0.15 1.3,0.85
3D body "RN_VISHAY_PRA100I4.stp": height 0.5, standoff 0, extent -0.8,-2 0.8,2

## RN_VISHAY_TOMC16 [mm] "SOIC,1.27mm, Pitch;16 Pin, 5.89mm W X 11.176mm L X 2.03mm H body, Serie TOMC"
height 2.03
pads (16):
  rect 1.45x0.65 smd: 1(-3.6,4.445) 2(-3.6,3.175) 3(-3.6,1.905) 4(-3.6,0.635) 5(-3.6,-0.635) 6(-3.6,-1.905) 7(-3.6,-3.175) 8(-3.6,-4.445) 9(3.6,-4.445) 10(3.6,-3.175) 11(3.6,-1.905) 12(3.6,-0.635) 13(3.6,0.635) 14(3.6,1.905) 15(3.6,3.175) 16(3.6,4.445)
Top Overlay:
  circle w0.5: c-1.55,4.6 r0.25
  circle w0.25: c-4.05,5.35 r0.125
  lines w0.2: -2.55,-5.6 2.55,-5.6 2.55,5.6 -2.55,5.6 -2.55,-5.6
Top Designator:
  text ".Designator" at -7.618,-0.508 h1.52
Top Assembly:
  circle w0.1: c-1.945,4.588 r0.5
  lines w0.1: -2.945,-5.588 -2.945,5.588 2.945,5.588 2.945,-5.588 -2.945,-5.588
Bottom 3D Body:
  circle w0.05: c0,0 r0.35
  lines w0.05: -0.5,0 0.5,0 ; 0,-0.5 0,0.5 ; -4.6,-6 4.6,-6 4.6,6 -4.6,6 -4.6,-6
3D body "p145-065.stp": height 0.02, standoff 0, extent -4.325,-4.77 -2.875,-4.12
3D body "p145-065.stp": height 0.02, standoff 0, extent -4.325,-3.5 -2.875,-2.85
3D body "p145-065.stp": height 0.02, standoff 0, extent -4.325,-0.96 -2.875,-0.31
3D body "p145-065.stp": height 0.02, standoff 0, extent -4.325,0.31 -2.875,0.96
3D body "p145-065.stp": height 0.02, standoff 0, extent -4.325,2.85 -2.875,3.5
3D body "p145-065.stp": height 0.02, standoff 0, extent -4.325,4.12 -2.875,4.77
3D body "p145-065.stp": height 0.02, standoff 0, extent 2.875,-4.77 4.325,-4.12
3D body "p145-065.stp": height 0.02, standoff 0, extent 2.875,-3.5 4.325,-2.85
3D body "p145-065.stp": height 0.02, standoff 0, extent 2.875,-0.96 4.325,-0.31
3D body "p145-065.stp": height 0.02, standoff 0, extent 2.875,0.31 4.325,0.96
3D body "p145-065.stp": height 0.02, standoff 0, extent 2.875,2.85 4.325,3.5
3D body "p145-065.stp": height 0.02, standoff 0, extent 2.875,4.12 4.325,4.77
3D body "p145-065.stp": height 0.02, standoff 0, extent -4.325,-2.23 -2.875,-1.58
3D body "p145-065.stp": height 0.02, standoff 0, extent -4.325,1.5 -2.875,2.15
3D body "p145-065.stp": height 0.02, standoff 0, extent 2.875,-2.23 4.325,-1.58
3D body "p145-065.stp": height 0.02, standoff 0, extent 2.875,1.58 4.325,2.23
3D body "RN_VISHAY_TOMC16.stp": height 2.05, standoff -0.02, extent -3.796,-5.588 3.797,5.588